# Altium footprint library PcbLib.PcbLib: 79 footprints (part 3 of 5)
Each footprint in its own frame and in the unit in brackets; x right, y up, seen from the top. Pads: shape width x height; smd on the part's side, far side on the other; paste and mask are expansions set on the pad; w line width, h text height; cw(c..) or ccw(c..) is an arc to the next point about the centre after c.
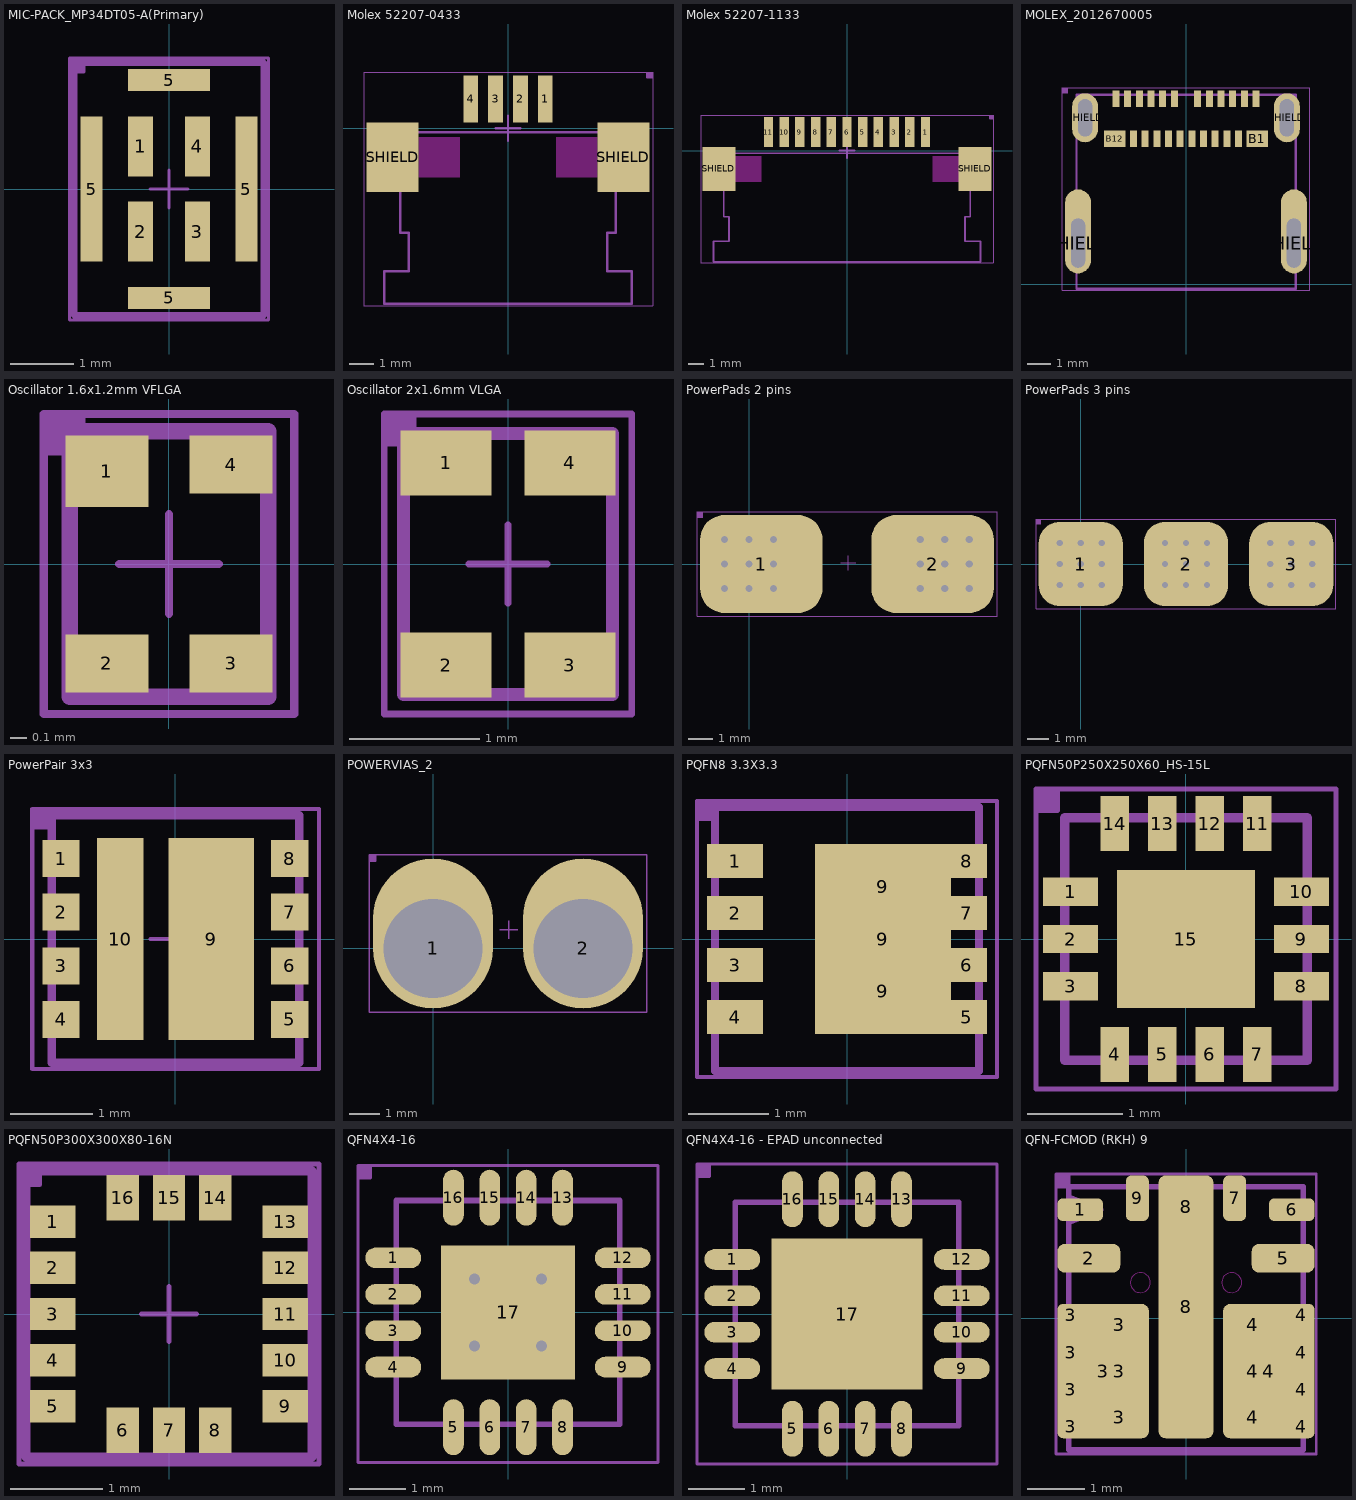
[diagram p2: the footprints below, top view; thin cyan lines are the x and y axes]

## MIC-PACK_MP34DT05-A(Primary) [mm]
pads (8):
  rect 0.4x0.95 smd: 1(-0.45,0.675) 2(-0.45,-0.675) 3(0.45,-0.675) 4(0.45,0.675)
  rect 0.35x2.3 smd: 5(-1.225,0) 5(1.225,0)
  rect 1.3x0.35 smd: 5(0,-1.725) 5(0,1.725)
TopBody:
  lines w0.1: -1.5,-2 -1.5,2 1.5,2 1.5,-2 -1.5,-2
TopCourtyard:
  region: -1.575,2.075 -1.575,1.85 -1.35,1.85 -1.35,2.075
  lines w0.05: -1.575,1.85 -1.35,1.85 -1.35,2.075 ; -0.3,0 0.3,0 ; 0,-0.3 0,0.3 ; -1.575,-2.075 1.575,-2.075 1.575,2.075 -1.575,2.075 -1.575,-2.075
3D body: height 1, standoff 0, extent -1.5,-2 1.5,2
3D body: height 1.01, standoff 1, extent -1.421,1.721 -1.221,1.92
3D body: height 1.02, standoff 1.01, extent -0.349,-1.13 0.35,-0.433
3D body: height 1.01, standoff 1, extent -0.649,-1.43 0.649,-0.135

## Molex 52207-0433 [mm]
height 2.7
pads (6):
  rect 0.6x1.9 smd: 1(1.5,1.175) 2(0.5,1.175) 3(-0.5,1.175) 4(-1.5,1.175)
  rect 2.1x2.8 smd: SHIELD(-4.65,-1.175) SHIELD(4.65,-1.175)
Top Layer keep-out:
  region: -3.6,-0.375 -1.95,-0.375 -1.95,-1.975 -3.6,-1.975
  region: 3.6,-0.375 1.95,-0.375 1.95,-1.975 3.6,-1.975
TopBody:
  lines w0.1: -5.15,-2.175 -4.35,-2.175 -4.35,-4.225 -4.012,-4.225 -4.012,-5.765 -5,-5.765 -5,-7.075 5,-7.075 5,-5.765 4.012,-5.765 4.012,-4.225 4.35,-4.225 4.35,-2.175 5.15,-2.175 5.15,-0.175 -5.15,-0.175 -5.15,-2.175
TopCourtyard:
  region: 5.605,2.25 5.605,2.025 5.83,2.025 5.83,2.25
  lines w0.05: 5.605,2.25 5.605,2.025 5.83,2.025 ; -5.825,-7.16 5.83,-7.16 5.83,2.25 -5.825,2.25 -5.825,-7.16
  lines w0.1: -0.5,0 0.5,0 ; 0,-0.5 0,0.5
3D body "522070433.stp": height 2.71, standoff 0.01, extent -5.15,-7.075 5.15,1.825

## Molex 52207-1133 [mm]
height 2.7
pads (13):
  rect 0.6x1.9 smd: 1(5,1.175) 2(4,1.175) 3(3,1.175) 4(2,1.175) 5(1,1.175) 6(0,1.175) 7(-1,1.175) 8(-2,1.175) 9(-3,1.175) 10(-4,1.175) 11(-5,1.175)
  rect 2.1x2.8 smd: SHIELD(-8.15,-1.175) SHIELD(8.15,-1.175)
Top Layer keep-out:
  region: -7.1,-0.375 -5.45,-0.375 -5.45,-1.975 -7.1,-1.975
  region: 7.1,-0.375 5.45,-0.375 5.45,-1.975 7.1,-1.975
TopBody:
  lines w0.1: -8.65,-2.175 -8.65,-0.175 8.65,-0.175 8.65,-2.175 7.85,-2.175 7.85,-4.225 7.512,-4.225 7.512,-5.765 8.5,-5.765 8.5,-7.075 -8.5,-7.075 -8.5,-5.765 -7.512,-5.765 -7.512,-4.225 -7.85,-4.225 -7.85,-2.175 -8.65,-2.175
TopCourtyard:
  region: 9.1,2.25 9.1,2.025 9.325,2.025 9.325,2.25
  lines w0.05: 9.1,2.25 9.1,2.025 9.325,2.025 ; -9.325,-7.15 -9.325,2.25 9.325,2.25 9.325,-7.15 -9.325,-7.15
  lines w0.1: -0.5,0 0.5,0 ; 0,-0.5 0,0.5
3D body "522071133.stp": height 2.71, standoff 0.01, extent -8.65,-7.075 8.65,1.825

## MOLEX_2012670005 [mm]
height 3.71
pads (28):
  rect 0.3x0.7 smd: A1(-3.005,7.94) A2(-2.505,7.94) A3(-2.005,7.94) A4(-1.505,7.94) A5(-1.005,7.94) A6(-0.505,7.94) A7(0.495,7.94) A8(0.995,7.94) A9(1.495,7.94) A10(1.995,7.94) A11(2.495,7.94) A12(2.995,7.94) B2(2.245,6.24) B3(1.745,6.24) B4(1.245,6.24) B5(0.745,6.24) B6(0.245,6.24) B7(-0.255,6.24) B8(-0.755,6.24) B9(-1.255,6.24) B10(-1.755,6.24) B11(-2.255,6.24)
  rect 0.9x0.7 smd: B1(3.045,6.24) B12(-3.055,6.24)
  oval 1.1x3.6 / inner round 0 / far side oval 1.1x3.6 hole 0.6 slot 2.1 at 90 deg copper offset 0,0.5: SHIELD(-4.625,1.77) SHIELD(4.615,1.77)
  oval 1.1x2.1 / inner round 0 / far side oval 1.1x2.1 hole 0.6 slot 1.6 at 90 deg: SHIELD(-4.325,7.13) SHIELD(4.315,7.13)
TopBody:
  lines w0.1: -4.695,-0.18 4.695,-0.18 4.695,8.12 -4.695,8.12 -4.695,-0.18
TopCourtyard:
  region: -5.3,8.42 -5.3,8.195 -5.075,8.195 -5.075,8.42
  lines w0.05: -5.3,8.195 -5.075,8.195 -5.075,8.42 ; -5.3,-0.255 5.295,-0.255 5.295,8.42 -5.3,8.42 -5.3,-0.255
3D body "2012670005.stp": height 3.69, standoff -2.32, extent -4.695,-0.18 4.695,8.12

## Oscillator 1.6x1.2mm VFLGA [mm]
height 0.84
pads (4):
  rect 0.5x0.43 smd: 1(-0.375,0.56)
  rect 0.5x0.35 smd: 2(-0.375,-0.6) 3(0.375,-0.6) 4(0.375,0.6)
TopBody:
  lines w0.1: -0.6,-0.8 -0.6,0.8 0.6,0.8 0.6,-0.8 -0.6,-0.8
TopCourtyard:
  region: -0.755,0.905 -0.755,0.68 -0.53,0.68 -0.53,0.905
  lines w0.05: -0.3,0 0.3,0 ; 0,-0.3 0,0.3 ; -0.53,0.68 -0.755,0.68 -0.53,0.68 ; -0.53,0.68 -0.53,0.905 -0.53,0.68 ; -0.755,-0.905 0.755,-0.905 0.755,0.905 -0.755,0.905 -0.755,-0.905
3D body: height 1.01, standoff 1, extent -0.521,0.521 -0.321,0.72
3D body: height 0.84, standoff 0, extent -0.6,-0.8 0.6,0.8

## Oscillator 2x1.6mm VLGA [mm]
height 0.84
pads (4):
  rect 0.7x0.5 smd: 1(-0.475,0.775) 2(-0.475,-0.775) 3(0.475,-0.775) 4(0.475,0.775)
TopBody:
  lines w0.1: -0.8,-1 -0.8,1 0.8,1 0.8,-1 -0.8,-1
TopCourtyard:
  region: -0.95,1.15 -0.95,0.925 -0.725,0.925 -0.725,1.15
  lines w0.05: -0.3,0 0.3,0 ; 0,-0.3 0,0.3 ; -0.725,0.925 -0.725,1.15 -0.725,0.925 ; -0.725,0.925 -0.95,0.925 -0.725,0.925 ; -0.95,-1.15 -0.95,1.15 0.95,1.15 0.95,-1.15 -0.95,-1.15
3D body: height 0.84, standoff 0, extent -0.8,-1 0.8,1

## PowerPads 2 pins [mm]
pads (2):
  rrect50% 5x4 smd paste-10: 1(0.5,0) 2(7.5,0)
via -1,1 diameter 0.5 hole 0.3
via 0,1 diameter 0.5 hole 0.3
via 1,1 diameter 0.5 hole 0.3
via 1,0 diameter 0.5 hole 0.3
via 0,0 diameter 0.5 hole 0.3
via -1,0 diameter 0.5 hole 0.3
via -1,-1 diameter 0.5 hole 0.3
via 0,-1 diameter 0.5 hole 0.3
via 1,-1 diameter 0.5 hole 0.3
via 9,-1 diameter 0.5 hole 0.3
via 8,-1 diameter 0.5 hole 0.3
via 7,-1 diameter 0.5 hole 0.3
via 7,0 diameter 0.5 hole 0.3
via 8,0 diameter 0.5 hole 0.3
via 9,0 diameter 0.5 hole 0.3
via 9,1 diameter 0.5 hole 0.3
via 8,1 diameter 0.5 hole 0.3
via 7,1 diameter 0.5 hole 0.3
TopCourtyard:
  region: -2.125,2.125 -2.125,1.9 -1.9,1.9 -1.9,2.125
  lines w0.05: -2.125,1.9 -1.9,1.9 -1.9,2.125 ; 3.75,0.045 4.35,0.045 ; 4.05,-0.255 4.05,0.345 ; -2.125,-2.13 -2.125,2.125 10.13,2.125 10.13,-2.13 -2.125,-2.13

## PowerPads 3 pins [mm]
pads (3):
  rrect50% 4x4 smd paste-10: 1(0,0) 2(5,0) 3(10,0)
via 9,1 diameter 0.5 hole 0.3
via 10,1 diameter 0.5 hole 0.3
via 11,1 diameter 0.5 hole 0.3
via 11,0 diameter 0.5 hole 0.3
via 10,0 diameter 0.5 hole 0.3
via 9,0 diameter 0.5 hole 0.3
via 9,-1 diameter 0.5 hole 0.3
via 10,-1 diameter 0.5 hole 0.3
via 11,-1 diameter 0.5 hole 0.3
via 4,1 diameter 0.5 hole 0.3
via 5,1 diameter 0.5 hole 0.3
via 6,1 diameter 0.5 hole 0.3
via 6,0 diameter 0.5 hole 0.3
via 5,0 diameter 0.5 hole 0.3
via 4,0 diameter 0.5 hole 0.3
via 4,-1 diameter 0.5 hole 0.3
via 5,-1 diameter 0.5 hole 0.3
via 6,-1 diameter 0.5 hole 0.3
via 1,-1 diameter 0.5 hole 0.3
via 0,-1 diameter 0.5 hole 0.3
via -1,-1 diameter 0.5 hole 0.3
via -1,0 diameter 0.5 hole 0.3
via 0,0 diameter 0.5 hole 0.3
via 1,0 diameter 0.5 hole 0.3
via 1,1 diameter 0.5 hole 0.3
via 0,1 diameter 0.5 hole 0.3
via -1,1 diameter 0.5 hole 0.3
TopCourtyard:
  region: -2.125,2.13 -2.125,1.905 -1.9,1.905 -1.9,2.13
  lines w0.05: -2.125,1.905 -1.9,1.905 -1.9,2.13 ; 4.7,0 5.3,0 ; 5,-0.3 5,0.3 ; -2.125,-2.13 -2.125,2.13 12.125,2.13 12.125,-2.13 -2.125,-2.13

## PowerPair 3x3 [mm]
height 0.75
pads (10):
  rect 0.45x0.45 smd: 1(-1.386,0.975) 2(-1.386,0.325) 3(-1.386,-0.325) 4(-1.386,-0.975) 5(1.386,-0.975) 6(1.386,-0.325) 7(1.386,0.325) 8(1.386,0.975)
  rect 1.036x2.45 smd: 9(0.434,0)
  rect 0.562x2.45 smd: 10(-0.671,0)
TopBody:
  lines w0.1: -1.5,-1.5 -1.5,1.5 ; -1.5,-1.5 -1.5,-1.5 ; -1.5,-1.5 1.5,-1.5 ; -1.5,1.5 1.5,1.5 ; -1.5,1.5 -1.5,1.5 ; 1.5,-1.5 1.5,-1.5 ; 1.5,-1.5 1.5,1.5 ; 1.5,1.5 1.5,1.5
TopCourtyard:
  region: -1.735,1.575 -1.735,1.35 -1.51,1.35 -1.51,1.575
  lines w0.05: -1.735,1.35 -1.51,1.35 -1.51,1.575 ; -0.3,0 0.3,0 ; 0,-0.3 0,0.3 ; -1.735,-1.575 -1.735,1.575 1.74,1.575 1.74,-1.575 -1.735,-1.575
3D body: height 0.75, standoff 0, extent -1.5,-1.5 1.5,1.5

## POWERVIAS_2 [mm]
pads (4):
  round 0 / inner round 0 / far side round 4 all layers, no hole: 1(0,0) 2(5,0)
  oval 4x5 / inner round 0 / far side round 0 hole 3.3 copper offset 0,0.5: 1(0,0) 2(5,0)
TopCourtyard:
  region: -2.13,3.13 -2.13,2.905 -1.905,2.905 -1.905,3.13
  lines w0.05: -2.13,2.905 -1.905,2.905 -1.905,3.13 ; 2.22,0.625 2.82,0.625 ; 2.52,0.325 2.52,0.925 ; -2.13,-2.125 7.13,-2.125 7.13,3.13 -2.13,3.13 -2.13,-2.125

## PQFN8 3.3X3.3 [mm]
pads (11):
  rect 0.7x0.42 smd: 1(-1.4,0.975) 2(-1.4,0.325) 3(-1.4,-0.325) 4(-1.4,-0.975)
  rect 0.5x0.42 smd: 5(1.5,-0.975) 6(1.5,-0.325) 7(1.5,0.325) 8(1.5,0.975)
  rect 1x0.7 smd: 9(0.45,-0.65) 9(0.45,0.65)
  rect 1.7x2.37 smd paste-10: 9(0.45,0)
TopBody:
  lines w0.1: -1.65,1.65 1.65,1.65 ; -1.65,1.65 -1.65,1.65 ; -1.65,1.65 -1.65,-1.65 1.65,-1.65 1.65,1.65 ; 1.65,1.65 1.65,1.65
TopCourtyard:
  region: -1.875,1.725 -1.875,1.5 -1.65,1.5 -1.65,1.725
  lines w0.05: -1.875,1.5 -1.65,1.5 -1.65,1.725 ; -0.3,0 0.3,0 ; 0,-0.3 0,0.3 ; -1.875,-1.725 -1.875,1.725 1.875,1.725 1.875,-1.725 -1.875,-1.725
3D body "PQFN8.STEP": height 0.8, standoff -0.05, extent -1.65,-1.65 1.65,1.65

## PQFN50P250X250X60_HS-15L [mm] "PQFN, 14-Leads, Body 2.50x2.50mm, Pitch 0.50mm, Thermal Pad 1.45x1.45mm, IPC High Density"
height 0.6
pads (15):
  rect 0.58x0.3 smd mask+0.05: 1(-1.215,0.5) 2(-1.215,0) 3(-1.215,-0.5) 8(1.215,-0.5) 9(1.215,0) 10(1.215,0.5)
  rect 0.3x0.58 smd mask+0.05: 4(-0.75,-1.215) 5(-0.25,-1.215) 6(0.25,-1.215) 7(0.75,-1.215) 11(0.75,1.215) 12(0.25,1.215) 13(-0.25,1.215) 14(-0.75,1.215)
  rect 1.45x1.45 smd paste-0.75 mask+0.05: 15(0,0)
Top Paste:
  rectangle: -0.675,0.1 -0.1,0.675
  region: -0.1,-0.675 -0.1,-0.1 -0.675,-0.1 -0.675,-0.675
  region: 0.1,0.675 0.1,0.1 0.675,0.1 0.675,0.675
  region: 0.675,-0.1 0.1,-0.1 0.1,-0.675 0.675,-0.675
TopBody:
  lines w0.1: -1.275,-1.275 1.275,-1.275 1.275,1.275 -1.275,1.275 -1.275,-1.275
TopCourtyard:
  region: -1.58,1.58 -1.58,1.355 -1.355,1.355 -1.355,1.58
  lines w0.05: -1.58,1.355 -1.355,1.355 -1.355,1.58 ; -0.5,0 0,0 ; 0,-0.5 0,0 ; 0,0.5 0,0 ; 0.5,0 0,0 ; -1.58,-1.58 1.58,-1.58 1.58,1.58 -1.58,1.58 -1.58,-1.58
3D body "PQFN50P250X250X60_HS-15L.step": height 0.6, standoff 0, extent -1.275,-1.275 1.275,1.275

## PQFN50P300X300X80-16N [mm]
pads (16):
  rect 0.49x0.35 smd mask+0.08: 1(-1.26,1) 2(-1.26,0.5) 3(-1.26,0) 4(-1.26,-0.5) 5(-1.26,-1) 9(1.26,-1) 10(1.26,-0.5) 11(1.26,0) 12(1.26,0.5) 13(1.26,1)
  rect 0.35x0.49 smd mask+0.08: 6(-0.5,-1.26) 7(0,-1.26) 8(0.5,-1.26) 14(0.5,1.26) 15(0,1.26) 16(-0.5,1.26)
Top Paste:
  region: -1.125,-1.495 -0.875,-1.495 -0.875,-1.055 -1,-1.055 -1.125,-1.18
  region: 1.495,-1.125 1.495,-0.875 1.055,-0.875 1.055,-1 1.18,-1.125
  region: 1.125,1.495 0.875,1.495 0.875,1.055 1,1.055 1.125,1.18
  region: -1.495,1.125 -1.495,0.875 -1.055,0.875 -1.055,1 -1.18,1.125
  region: -1.495,-1.125 -1.495,-0.875 -1.055,-0.875 -1.055,-1 -1.18,-1.125
  region: 1.125,-1.495 0.875,-1.495 0.875,-1.055 1,-1.055 1.125,-1.18
  region: 1.495,1.125 1.495,0.875 1.055,0.875 1.055,1 1.18,1.125
  region: -1.125,1.495 -0.875,1.495 -0.875,1.055 -1,1.055 -1.125,1.18
TopBody:
  circle w0.1: c-1.25,1 r0.05
  lines w0.1: -1.55,-1.55 1.55,-1.55 1.55,1.55 -1.55,1.55 -1.55,-1.55
TopCourtyard:
  region: -1.625,1.625 -1.625,1.4 -1.4,1.4 -1.4,1.625
  lines w0.05: -1.625,1.4 -1.4,1.4 -1.4,1.625 ; -0.3,0 0.3,0 ; 0,-0.3 0,0.3 ; -1.625,-1.625 -1.625,1.625 1.625,1.625 1.625,-1.625 -1.625,-1.625
3D body: height 0.8, standoff 0, extent -1.55,-1.55 1.55,1.55

## QFN4X4-16 [mm] "Quad Flat No Lead, Plastic; 16 Terminals; Body 4 x 4 mm; Pitch 0.65 mm"
height 0.8
pads (17):
  oval 1x0.37 smd: 1(-2.05,0.975) 2(-2.05,0.325) 3(-2.05,-0.325) 4(-2.05,-0.975) 9(2.05,-0.975) 10(2.05,-0.325) 11(2.05,0.325) 12(2.05,0.975)
  oval 0.37x1 smd: 5(-0.975,-2.05) 6(-0.325,-2.05) 7(0.325,-2.05) 8(0.975,-2.05) 13(0.975,2.05) 14(0.325,2.05) 15(-0.325,2.05) 16(-0.975,2.05)
  rect 2.4x2.4 smd: 17(0,0)
via 0.6,0.6 diameter 0.5 hole 0.2
via 0.6,-0.6 diameter 0.5 hole 0.2
via -0.6,-0.6 diameter 0.5 hole 0.2
via -0.6,0.6 diameter 0.5 hole 0.2
TopBody:
  lines w0.1: -2,-2 2,-2 2,2 -2,2 -2,-2
TopCourtyard:
  region: -2.68,2.625 -2.68,2.4 -2.455,2.4 -2.455,2.625
  lines w0.05: -2.68,2.4 -2.455,2.4 -2.455,2.625 ; -0.3,0 0.3,0 ; 0,-0.3 0,0.3 ; -2.68,-2.68 2.68,-2.68 2.68,2.625 -2.68,2.625 -2.68,-2.68
3D body "qfn16-4x4.step": height 0.92, standoff 0, extent -2,-2 2,2

## QFN4X4-16 - EPAD unconnected [mm] "Quad Flat No Lead, Plastic; 16 Terminals; Body 4 x 4 mm; Pitch 0.65 mm"
height 0.8
pads (17):
  oval 1x0.37 smd: 1(-2.05,0.975) 2(-2.05,0.325) 3(-2.05,-0.325) 4(-2.05,-0.975) 9(2.05,-0.975) 10(2.05,-0.325) 11(2.05,0.325) 12(2.05,0.975)
  oval 0.37x1 smd: 5(-0.975,-2.05) 6(-0.325,-2.05) 7(0.325,-2.05) 8(0.975,-2.05) 13(0.975,2.05) 14(0.325,2.05) 15(-0.325,2.05) 16(-0.975,2.05)
  rect 2.7x2.7 smd paste-5: 17(0,0)
Top Paste:
  rectangle: -1.2,0.1 -0.1,1.2
  region: 0.1,1.2 0.1,0.1 1.2,0.1 1.2,1.2
  region: 1.2,-0.1 0.1,-0.1 0.1,-1.2 1.2,-1.2
  region: -0.1,-1.2 -0.1,-0.1 -1.2,-0.1 -1.2,-1.2
TopBody:
  lines w0.1: -2,-2 2,-2 2,2 -2,2 -2,-2
TopCourtyard:
  region: -2.68,2.68 -2.68,2.455 -2.455,2.455 -2.455,2.68
  lines w0.05: -2.68,2.455 -2.455,2.455 -2.455,2.68 ; -0.3,0 0.3,0 ; 0,-0.3 0,0.3 ; -2.68,-2.68 2.68,-2.68 2.68,2.68 -2.68,2.68 -2.68,-2.68
3D body "qfn16-4x4.step": height 0.92, standoff 0, extent -2,-2 2,2

## QFN-FCMOD (RKH) 9 [mm]
height 2.1
pads (24):
  rrect50% 0.8x0.4 smd paste-0.05 mask-0.05: 1(-1.85,1.9) 6(1.85,1.9)
  rrect50% 1.1x0.5 smd paste-0.05 mask-0.05: 2(-1.7,1.05) 5(1.7,1.05)
  rrect50% 0.475x0.4 smd paste-0.05 mask-0.05: 3(-2.013,-1.9) 3(-2.013,-1.25) 3(-2.013,-0.6) 3(-2.013,0.05) 4(2.013,-1.9) 4(2.013,-1.25) 4(2.013,-0.6) 4(2.013,0.05)
  rrect15% 1.6x2.35 smd paste-1.5 mask-1.168: 3(-1.45,-0.925) 4(1.45,-0.925)
  rrect30% 1.02x0.71 smd paste-0.05 mask-0.05: 3(-1.165,-1.735) 3(-1.165,-0.925) 3(-1.165,-0.115) 4(1.165,-1.735) 4(1.165,-0.925) 4(1.165,-0.115)
  rrect50% 0.4x0.8 smd paste-0.05 mask-0.05: 7(0.85,2.1) 9(-0.85,2.1)
  rrect25% 0.96x4.6 smd paste-1 mask-2.286: 8(0,0.2)
  rrect50% 0.5x1.1 smd paste-0.05 mask-0.05: 8(0,1.95)
Top Layer:
  pour cut-out: -1.875,0.2 -1.875,-0.1 -1.865,-0.101 -1.847,-0.108 -1.833,-0.122 -1.826,-0.14 -1.825,-0.15 -1.825,-0.4 -1.826,-0.41 -1.833,-0.428 -1.847,-0.442 -1.865,-0.449 -1.875,-0.45 -1.875,-0.75 -1.865,-0.751 -1.847,-0.758 -1.833,-0.772 -1.826,-0.79 -1.825,-0.8 -1.825,-1.05 -1.826,-1.06 -1.833,-1.078 -1.847,-1.092 -1.865,-1.099 -1.875,-1.1 -1.875,-1.4 -1.865,-1.401 -1.847,-1.408 -1.833,-1.422 -1.826,-1.44 -1.825,-1.45 -1.825,-1.7 -1.826,-1.71 -1.833,-1.728 -1.847,-1.742 -1.865,-1.749 -1.875,-1.75 -1.875,-2.05 -0.75,-2.05 -0.74,-2.05 -0.722,-2.042 -0.708,-2.028 -0.7,-2.01 -0.7,-2 -0.7,0.125 -0.7,0.14 -0.711,0.167 -0.733,0.189 -0.76,0.2 -0.775,0.2
  pour cut-out: 1.875,0.2 1.875,-0.1 1.865,-0.101 1.847,-0.108 1.833,-0.122 1.826,-0.14 1.825,-0.15 1.825,-0.4 1.826,-0.41 1.833,-0.428 1.847,-0.442 1.865,-0.449 1.875,-0.45 1.875,-0.75 1.865,-0.751 1.847,-0.758 1.833,-0.772 1.826,-0.79 1.825,-0.8 1.825,-1.05 1.826,-1.06 1.833,-1.078 1.847,-1.092 1.865,-1.099 1.875,-1.1 1.875,-1.4 1.865,-1.401 1.847,-1.408 1.833,-1.422 1.826,-1.44 1.825,-1.45 1.825,-1.7 1.826,-1.71 1.833,-1.728 1.847,-1.742 1.865,-1.749 1.875,-1.75 1.875,-2.05 0.75,-2.05 0.74,-2.05 0.722,-2.042 0.708,-2.028 0.7,-2.01 0.7,-2 0.7,0.125 0.7,0.14 0.711,0.167 0.733,0.189 0.76,0.2 0.775,0.2
Top Layer keep-out:
  circle w0.001: c0.8,0.625 r0.175
  circle w0.001: c-0.8,0.625 r0.175
Top Solder:
  region: -0.16,2.449 -0.15,2.45 0.15,2.45 0.16,2.449 0.169,2.446 0.178,2.442 0.185,2.435 0.192,2.428 0.196,2.419 0.199,2.41 0.2,2.4 0.2,1.5 0.199,1.49 0.196,1.481 0.192,1.472 0.185,1.465 0.178,1.458 0.169,1.454 0.16,1.451 0.15,1.45 -0.15,1.45 -0.16,1.451 -0.169,1.454 -0.178,1.458 -0.185,1.465 -0.192,1.472 -0.196,1.481 -0.199,1.49 -0.2,1.5 -0.2,2.4 -0.199,2.41 -0.196,2.419 -0.192,2.428 -0.185,2.435 -0.178,2.442 -0.169,2.446
TopBody:
  lines w0.1: -2.05,1.68 -1.49,1.9 -2.05,2.12 ; -2.05,-2.3 2.05,-2.3 2.05,2.3 -2.05,2.3 -2.05,-2.3
TopCourtyard:
  region: -2.275,2.525 -2.275,2.3 -2.05,2.3 -2.05,2.525
  lines w0.05: -2.275,2.3 -2.05,2.3 -2.05,2.525 ; -0.175,0.23 0,0.23 ; 0,0.055 0,0.23 ; 0,0.405 0,0.23 ; 0.175,0.23 0,0.23 ; -2.275,-2.375 -2.275,2.525 2.28,2.525 2.28,-2.375 -2.275,-2.375
3D body: height 2.11, standoff 2.1, extent -1.67,1.321 -1.071,1.918
3D body: height 2.1, standoff 0, extent -2.032,-2.286 2.032,2.286